# Altium footprint library BRT_Components.PcbLib: 132 footprints (part 6 of 9)
Each footprint in its own frame and in the unit in brackets; x right, y up, seen from the top. Pads: shape width x height; smd on the part's side, far side on the other; paste and mask are expansions set on the pad; w line width, h text height; cw(c..) or ccw(c..) is an arc to the next point about the centre after c.
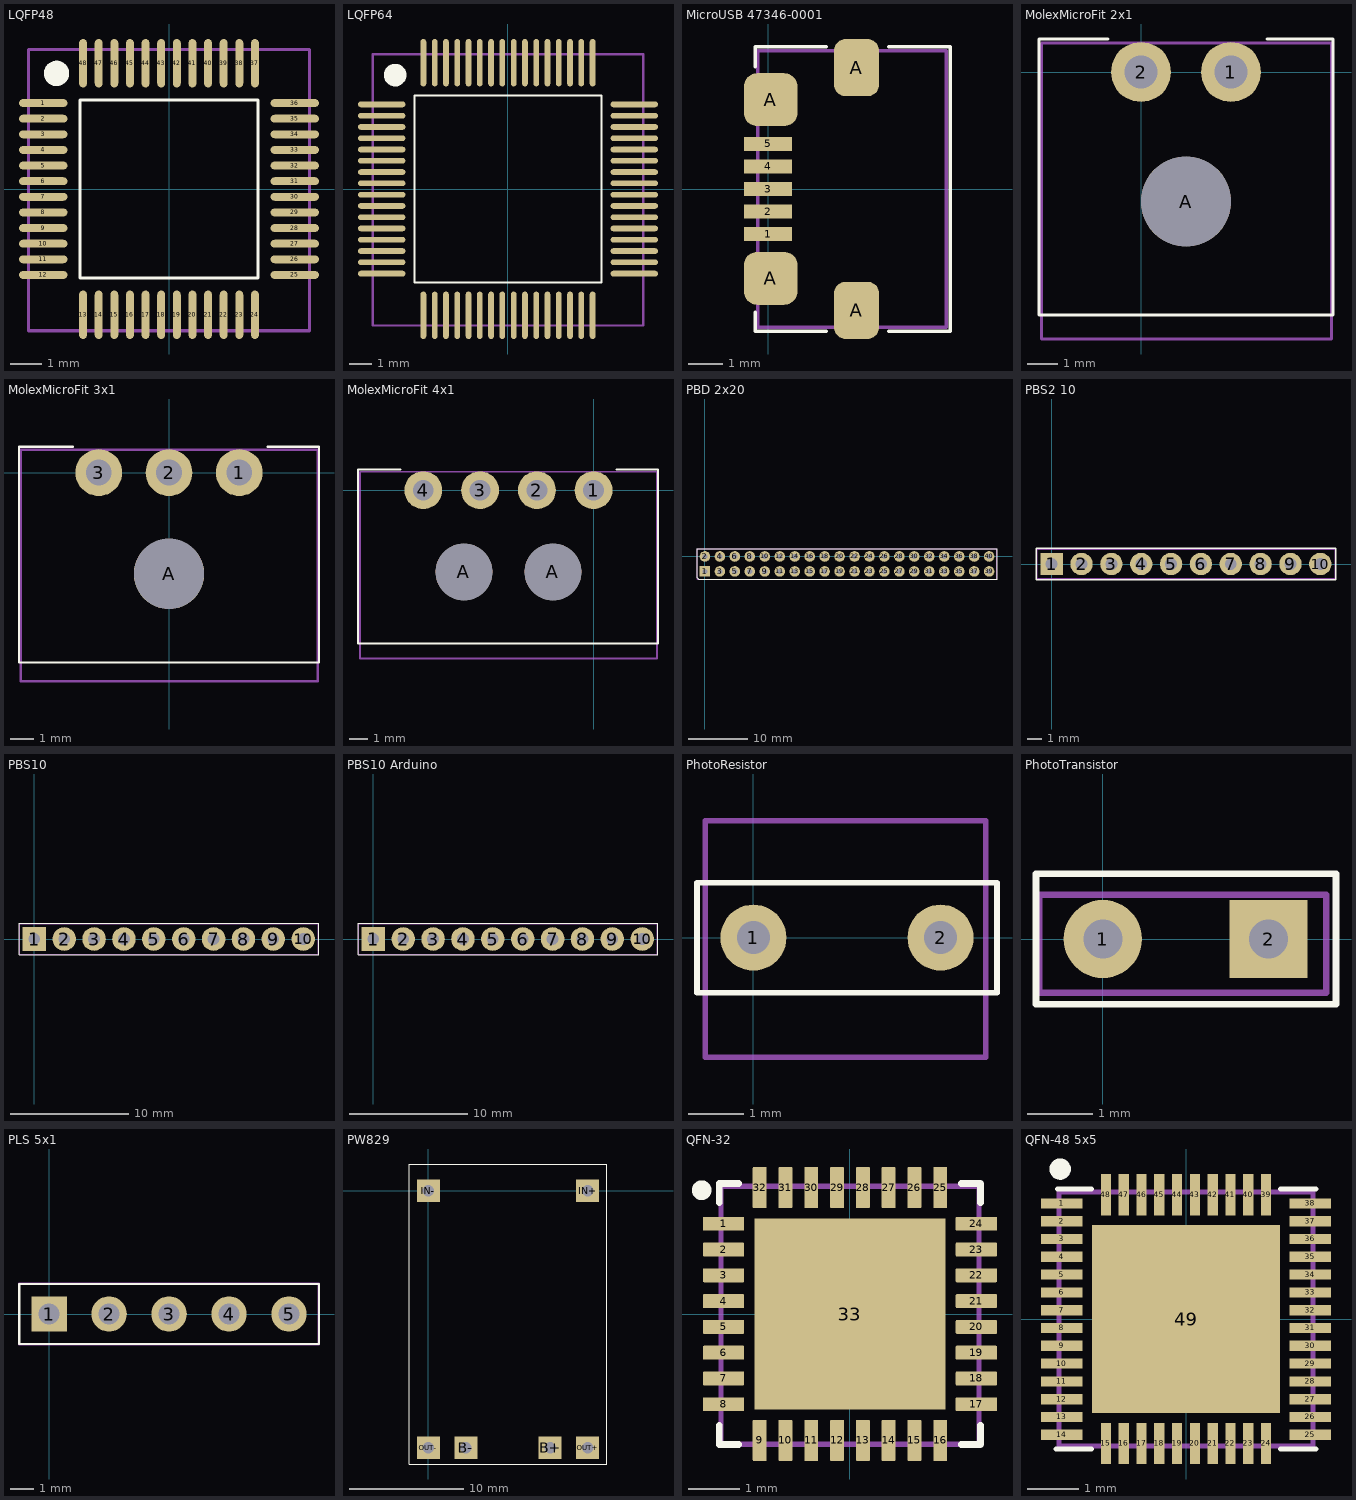
[diagram p5: the footprints below, top view; thin cyan lines are the x and y axes]

## LQFP48 [mm]
pads (48):
  oval 1.55x0.254 smd mask+0.02: 1(-4.025,2.75) 2(-4.025,2.25) 3(-4.025,1.75) 4(-4.025,1.25) 5(-4.025,0.75) 6(-4.025,0.25) 7(-4.025,-0.25) 8(-4.025,-0.75) 9(-4.025,-1.25) 10(-4.025,-1.75) 11(-4.025,-2.25) 12(-4.025,-2.75) 25(4.025,-2.75) 26(4.025,-2.25) 27(4.025,-1.75) 28(4.025,-1.25) 29(4.025,-0.75) 30(4.025,-0.25) 31(4.025,0.25) 32(4.025,0.75) 33(4.025,1.25) 34(4.025,1.75) 35(4.025,2.25) 36(4.025,2.75)
  oval 0.254x1.55 smd mask+0.02: 13(-2.75,-4.025) 14(-2.25,-4.025) 15(-1.75,-4.025) 16(-1.25,-4.025) 17(-0.75,-4.025) 18(-0.25,-4.025) 19(0.25,-4.025) 20(0.75,-4.025) 21(1.25,-4.025) 22(1.75,-4.025) 23(2.25,-4.025) 24(2.75,-4.025) 37(2.75,4.025) 38(2.25,4.025) 39(1.75,4.025) 40(1.25,4.025) 41(0.75,4.025) 42(0.25,4.025) 43(-0.25,4.025) 44(-0.75,4.025) 45(-1.25,4.025) 46(-1.75,4.025) 47(-2.25,4.025) 48(-2.75,4.025)
Top Overlay:
  circle w0.41: c-3.6,3.7 r0.2
  lines w0.1: -2.85,-2.85 2.85,-2.85 2.85,2.85 -2.85,2.85 -2.85,-2.85
Mechanical 13:
  lines w0.1: -4.5,-4.536 4.5,-4.536 4.5,4.464 -4.5,4.464 -4.5,-4.536
3D body "User Library-Quad50M48.step": height 1.56, standoff 0, extent -4.5,-4.536 4.5,4.464

## LQFP64 [mm]
pads (64):
  oval 2.1x0.254 smd paste+0 mask+0.02: 1(-5.6,3.75) 2(-5.6,3.25) 3(-5.6,2.75) 4(-5.6,2.25) 5(-5.6,1.75) 6(-5.6,1.25) 7(-5.6,0.75) 8(-5.6,0.25) 9(-5.6,-0.25) 10(-5.6,-0.75) 11(-5.6,-1.25) 12(-5.6,-1.75) 13(-5.6,-2.25) 14(-5.6,-2.75) 15(-5.6,-3.25) 16(-5.6,-3.75) 33(5.6,-3.75) 34(5.6,-3.25) 35(5.6,-2.75) 36(5.6,-2.25) 37(5.6,-1.75) 38(5.6,-1.25) 39(5.6,-0.75) 40(5.6,-0.25) 41(5.6,0.25) 42(5.6,0.75) 43(5.6,1.25) 44(5.6,1.75) 45(5.6,2.25) 46(5.6,2.75) 47(5.6,3.25) 48(5.6,3.75)
  oval 0.254x2.1 smd paste+0 mask+0.02: 17(-3.75,-5.6) 18(-3.25,-5.6) 19(-2.75,-5.6) 20(-2.25,-5.6) 21(-1.75,-5.6) 22(-1.25,-5.6) 23(-0.75,-5.6) 24(-0.25,-5.6) 25(0.25,-5.6) 26(0.75,-5.6) 27(1.25,-5.6) 28(1.75,-5.6) 29(2.25,-5.6) 30(2.75,-5.6) 31(3.25,-5.6) 32(3.75,-5.6) 49(3.75,5.6) 50(3.25,5.6) 51(2.75,5.6) 52(2.25,5.6) 53(1.75,5.6) 54(1.25,5.6) 55(0.75,5.6) 56(0.25,5.6) 57(-0.25,5.6) 58(-0.75,5.6) 59(-1.25,5.6) 60(-1.75,5.6) 61(-2.25,5.6) 62(-2.75,5.6) 63(-3.25,5.6) 64(-3.75,5.6)
Top Overlay:
  circle w0.6: c-5,5.05 r0.2
  lines w0.1: -4.15,-4.15 4.15,-4.15 4.15,4.15 -4.15,4.15 -4.15,-4.15
Mechanical 13:
  lines w0.1: -6,-6.05 6,-6.05 6,5.975 -6,5.975 -6,-6.05
3D body "User Library-LQFP64-1.step": height 1.56, standoff 0, extent -6,-6.025 6,5.975

## MicroUSB 47346-0001 [mm]
pads (9):
  rect 1.38x0.4 smd mask+0.044: 1(0,-1.3) 2(0,-0.65) 3(0,0) 4(0,0.65) 5(0,1.3)
  rrect50% 1.55x1.525 smd: A(0.075,-2.575) A(0.075,2.575)
  rrect50% 1.3x1.65 smd: A(2.55,3.5) A(2.55,-3.5)
Top Overlay:
  lines w0.1: -0.375,-3.55 -0.375,-4.1 1.675,-4.1 ; -0.375,3.525 -0.375,4.1 1.675,4.1 ; 3.475,-4.1 5.25,-4.1 5.25,4.1 3.475,4.1
Mechanical 13:
  lines w0.1: -0.3,-3.99 5.13,-3.99 5.13,3.99 -0.3,3.99 -0.3,-3.99
3D body "micro_usb_47346-0001.step": height 2.77, standoff -0.17, extent -0.3,-3.99 5.13,3.99

## MolexMicroFit 2x1 [mm]
pads (3):
  round 2 hole 1.1: 1(3,0) 2(0,0)
  round 3 hole 3: A(1.5,-4.32)
Top Overlay:
  lines w0.1: -1.1,1.1 -3.4,1.1 -3.4,-8.1 6.4,-8.1 6.4,1.1 4.2,1.1
Mechanical 13:
  lines w0.1: -3.325,-8.9 -3.325,0.975 6.35,0.975 6.35,-8.9 -3.325,-8.9
3D body "436500200.stp": height 5.64, standoff -3.27, extent -3.325,-8.9 6.325,1

## MolexMicroFit 3x1 [mm]
pads (4):
  round 2 hole 1.1: 1(3,0) 2(0,0) 3(-3,0)
  round 3 hole 3: A(0,-4.32)
Top Overlay:
  lines w0.1: -4.1,1.1 -6.4,1.1 -6.4,-8.1 6.4,-8.1 6.4,1.1 4.2,1.1
Mechanical 13:
  lines w0.1: -6.325,-8.9 -6.325,0.975 6.35,0.975 6.35,-8.9 -6.325,-8.9
3D body "436500300.stp": height 5.64, standoff -3.27, extent -6.325,-8.875 6.325,1.025

## MolexMicroFit 4x1 [mm]
pads (6):
  round 2 hole 1.1: 1(0,0) 2(-3,0) 3(-6,0) 4(-9,0)
  round 3 hole 3: A(-6.85,-4.32) A(-2.15,-4.32)
Top Overlay:
  lines w0.1: -10.2,1.1 -12.45,1.1 -12.45,-8.1 3.4,-8.1 3.4,1.1 1.2,1.1
Mechanical 13:
  lines w0.1: -12.35,-8.9 -12.35,0.975 3.35,0.975 3.35,-8.9 -12.35,-8.9
3D body "436500400.stp": height 5.64, standoff -3.27, extent -12.35,-8.875 3.3,1.025

## PBD 2x20 [mm]
pads (40):
  rect 1.8x1.8 hole 0.9: 1(0,-2.54)
  round 1.8 hole 0.9: 2(0,0) 3(2.54,-2.54) 4(2.54,0) 5(5.08,-2.54) 6(5.08,0) 7(7.62,-2.54) 8(7.62,0) 9(10.16,-2.54) 10(10.16,0) 11(12.7,-2.54) 12(12.7,0) 13(15.24,-2.54) 14(15.24,0) 15(17.78,-2.54) 16(17.78,0) 17(20.32,-2.54) 18(20.32,0) 19(22.86,-2.54) 20(22.86,0) 21(25.4,-2.54) 22(25.4,0) 23(27.94,-2.54) 24(27.94,0) 25(30.48,-2.54) 26(30.48,0) 27(33.02,-2.54) 28(33.02,0) 29(35.56,-2.54) 30(35.56,0) 31(38.1,-2.54) 32(38.1,0) 33(40.64,-2.54) 34(40.64,0) 35(43.18,-2.54) 36(43.18,0) 37(45.72,-2.54) 38(45.72,0) 39(48.26,-2.54) 40(48.26,0)
Top Overlay:
  lines w0.1: -1.35,-3.625 -1.35,1.35 49.6,1.35 49.6,-3.9 -1.075,-3.9 -1.35,-3.625
Mechanical 13:
  lines w0.1: -1.275,-3.825 49.525,-3.825 49.525,1.275 -1.275,1.275 -1.275,-3.825
3D body "User Library-PBD2_54-40.step": height 8.4, standoff -2.7, extent -1.27,-3.81 49.53,1.27

## PBS2 10 [mm]
pads (10):
  rect 1.5x1.5 hole 0.8: 1(0,0)
  round 1.5 hole 0.8: 2(2,0) 3(4,0) 4(6,0) 5(8,0) 6(10,0) 7(12,0) 8(14,0) 9(16,0) 10(18,0)
Top Overlay:
  lines w0.1: -1.05,-1.05 19.05,-1.05 19.05,1.05 -1.05,1.05 -1.05,-1.05
Mechanical 13:
  lines w0.1: -1,-1 -1,1 19,1 19,-1 -1,-1
3D body "User Library-PBS2-10.step": height 4.5, standoff -2.7, extent -1,-1 19,1

## PBS10 [mm]
pads (10):
  rect 2x2 hole 1: 1(0,0)
  round 2 hole 1: 2(2.54,0) 3(5.08,0) 4(7.62,0) 5(10.16,0) 6(12.7,0) 7(15.24,0) 8(17.78,0) 9(20.32,0) 10(22.86,0)
Top Overlay:
  lines w0.1: -1.3,-1.325 24.2,-1.325 24.2,1.325 -1.3,1.325 -1.3,-1.325
Mechanical 13:
  lines w0.1: -1.25,-1.275 24.15,-1.275 24.15,1.275 -1.25,1.275 -1.25,-1.275
3D body "User Library-PBS-10.step": height 8.4, standoff -3.2, extent -1.25,-1.275 24.15,1.265

## PBS10 Arduino [mm]
pads (10):
  rect 2x2 hole 1: 1(0,0)
  round 2 hole 1: 2(2.54,0) 3(5.08,0) 4(7.62,0) 5(10.16,0) 6(12.7,0) 7(15.24,0) 8(17.78,0) 9(20.32,0) 10(22.86,0)
Top Overlay:
  lines w0.1: -1.3,-1.325 24.2,-1.325 24.2,1.325 -1.3,1.325 -1.3,-1.325
Mechanical 13:
  lines w0.1: -1.25,-1.275 24.15,-1.275 24.15,1.275 -1.25,1.275 -1.25,-1.275
3D body "SIL_Socket10_.stp": height 8.5, standoff -10.46, extent -1.25,-1.27 24.15,1.27

## PhotoResistor [mm]
pads (2):
  round 1.2 hole 0.6: 1(0,0) 2(3.4,0)
Top Overlay:
  lines w0.1: -1.025,-1 -1.025,1 4.425,1 4.425,-1 -1.025,-1
Mechanical 13:
  lines w0.1: -0.875,-2.175 -0.875,2.125 4.225,2.125 4.225,-2.175 -0.875,-2.175
3D body "GL5528-Photoresistor.step": height 6.45, standoff -8.55, extent -0.875,-2.175 4.225,2.125

## PhotoTransistor [mm]
pads (2):
  round 1.2 hole 0.6: 1(0,0)
  rect 1.2x1.2 hole 0.6: 2(2.54,0)
Top Overlay:
  lines w0.1: -1.025,-1 3.575,-1 3.575,1 -1.025,1 -1.025,-1
Mechanical 13:
  lines w0.1: -0.975,-0.825 -0.975,0.675 3.425,0.675 3.425,-0.825 -0.975,-0.825
3D body "IR Sensor.step": height 8.86, standoff -10.56, extent -0.975,-0.825 3.425,0.675

## PLS 5x1 [mm] "Connector; Header; 5 Position"
pads (5):
  rect 1.5x1.5 hole 0.9: 1(0,0)
  round 1.5 hole 0.9: 2(2.54,0) 3(5.08,0) 4(7.62,0) 5(10.16,0)
Top Overlay:
  lines w0.1: -1.27,-1.27 -1.27,1.27 11.43,1.27 11.43,-1.27 -1.27,-1.27
Mechanical 13:
  lines w0.1: -1.275,-1.275 11.425,-1.275 11.425,1.275 -1.275,1.275 -1.275,-1.275
3D body "User Library-PLS-5.step": height 8.54, standoff -3, extent -1.275,-1.275 11.425,1.265

## PW829 [mm]
pads (6):
  rect 2x2 hole 1: B+(10.7,-22.6) B-(3.3,-22.6) IN+(14,0) IN-(0,0) OUT+(14,-22.6) OUT-(0,-22.6)
Top Overlay:
  lines w0.1: -1.675,-24.025 15.675,-24.025 15.675,2.35 -1.675,2.35 -1.675,-24.025
3D body "TP4056-Protect.stp": height 3.87, standoff 0.11, extent -1.65,-24 15.65,3.75

## QFN-32 [mm]
pads (33):
  rrect15% 0.8x0.27 smd mask+0.025: 1(-2.45,1.75) 2(-2.45,1.25) 3(-2.45,0.75) 4(-2.45,0.25) 5(-2.45,-0.25) 6(-2.45,-0.75) 7(-2.45,-1.25) 8(-2.45,-1.75) 17(2.45,-1.75) 18(2.45,-1.25) 19(2.45,-0.75) 20(2.45,-0.25) 21(2.45,0.25) 22(2.45,0.75) 23(2.45,1.25) 24(2.45,1.75)
  rrect15% 0.27x0.8 smd mask+0.025: 9(-1.75,-2.45) 10(-1.25,-2.45) 11(-0.75,-2.45) 12(-0.25,-2.45) 13(0.25,-2.45) 14(0.75,-2.45) 15(1.25,-2.45) 16(1.75,-2.45) 25(1.75,2.45) 26(1.25,2.45) 27(0.75,2.45) 28(0.25,2.45) 29(-0.25,2.45) 30(-0.75,2.45) 31(-1.25,2.45) 32(-1.75,2.45)
  rect 3.7x3.7 smd paste-3 mask+0.025: 33(0,0)
Top Overlay:
  circle w0.2: c-2.875,2.4 r0.09
  lines w0.127: -2.53,-2.156 -2.53,-2.53 -2.156,-2.53 ; -2.53,2.156 -2.53,2.53 -2.156,2.53 ; 2.156,-2.53 2.53,-2.53 2.53,-2.156 ; 2.156,2.53 2.53,2.53 2.53,2.156
Mechanical 13:
  lines w0.1: -2.5,-2.525 2.5,-2.525 2.5,2.475 -2.5,2.475 -2.5,-2.525
3D body "User Library-QFN32-1.step": height 0.92, standoff -0.01, extent -2.5,-2.525 2.501,2.475

## QFN-48 5x5 [mm]
pads (49):
  rect 0.81x0.2 smd mask+0.025: 1(-2.445,2.275) 2(-2.445,1.925) 3(-2.445,1.575) 4(-2.445,1.225) 5(-2.445,0.875) 6(-2.445,0.525) 7(-2.445,0.175) 8(-2.445,-0.175) 9(-2.445,-0.525) 10(-2.445,-0.875) 11(-2.445,-1.225) 12(-2.445,-1.575) 13(-2.445,-1.925) 14(-2.445,-2.275) 25(2.445,-2.275) 26(2.445,-1.925) 27(2.445,-1.575) 28(2.445,-1.225) 29(2.445,-0.875) 30(2.445,-0.525) 31(2.445,-0.175) 32(2.445,0.175) 33(2.445,0.525) 34(2.445,0.875) 35(2.445,1.225) 36(2.445,1.575) 37(2.445,1.925) 38(2.445,2.275)
  rect 0.2x0.81 smd mask+0.025: 15(-1.575,-2.445) 16(-1.225,-2.445) 17(-0.875,-2.445) 18(-0.525,-2.445) 19(-0.175,-2.445) 20(0.175,-2.445) 21(0.525,-2.445) 22(0.875,-2.445) 23(1.225,-2.445) 24(1.575,-2.445) 39(1.575,2.445) 40(1.225,2.445) 41(0.875,2.445) 42(0.525,2.445) 43(0.175,2.445) 44(-0.175,2.445) 45(-0.525,2.445) 46(-0.875,2.445) 47(-1.225,2.445) 48(-1.575,2.445)
  rect 3.7x3.7 smd paste-3 mask+0.025: 49(0,0)
Top Overlay:
  circle w0.22: c-2.475,2.95 r0.1
  lines w0.1: -2.555,-2.555 -1.86,-2.555 ; -2.53,2.555 -1.86,2.555 ; 1.86,-2.555 2.555,-2.555 ; 1.86,2.555 2.555,2.555
Mechanical 13:
  lines w0.1: -2.5,-2.5 2.5,-2.5 2.5,2.5 -2.5,2.5 -2.5,-2.5
3D body "ESP32-D0WD--3DModel-STEP-56544.STEP": height 0.9, standoff 0, extent -2.5,-2.5 2.5,2.5